# Altium schematic symbol library jlcpcb_2025_04_resistors_extended_2010.schlib: 1697 symbols (part 7 of 9)
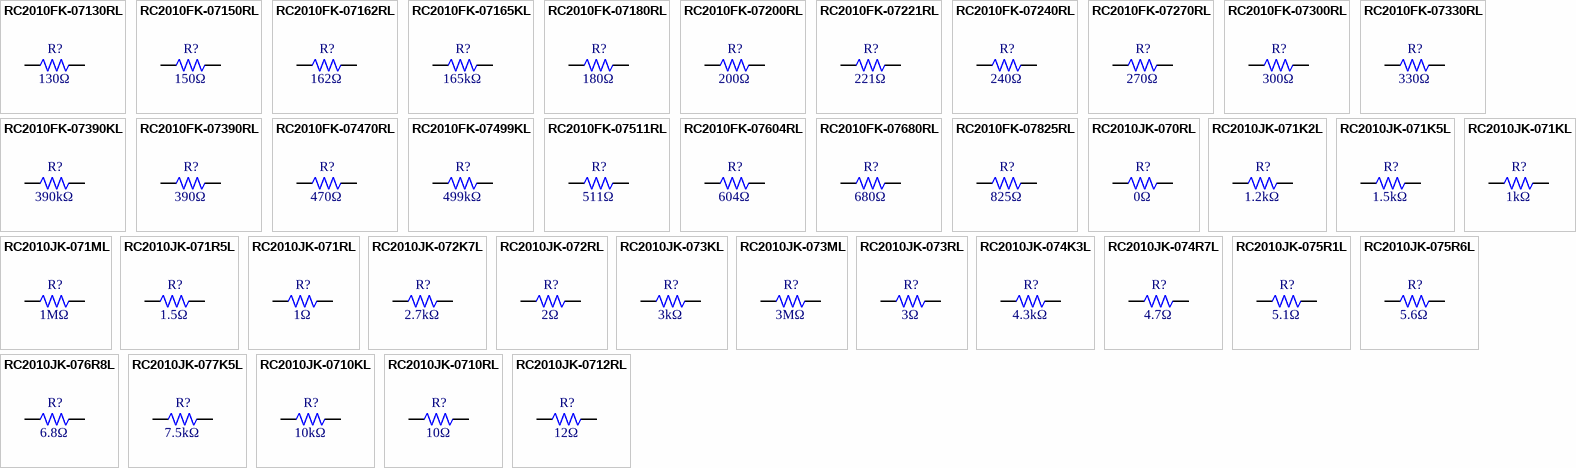
[diagram p48: symbols RC2010FK-07130RL to RC2010JK-0712RL]

## RC2010FK-07511RL
designator R?  Resistance: 511Ω  (hidden comment: *)
Resistor, 511Ω, ±1%, 750mW, 200V, ±100ppm/℃, -55℃~+155℃, SMD 2010; Manufacturer: Uniroyal; Manufacturer Part Number: RC2010FK-07511RL; Supplier 1: LCSC; Supplier Part Number 1: C137055; JLCPCB Part Number: C137055; Power Rating: 750mW; Category: Resistors; Package Size: 2010; JLCPCB Basic Part: Yes; Tolerance: ±1%; Voltage Rating: 200V; Temperature Coefficient: ±100ppm/℃; Temperature Rating: -55℃~+155℃; ComponentLink1Description: Datasheet; ComponentLink1URL: https://wmsc.lcsc.com/wmsc/upload/file/pdf/v2/lcsc/2304140030_YAGEO-RC2010FK-07511RL_C137055.pdf; ComponentLink2Description: JLCPCB Part URL; ComponentLink2URL: https://jlcpcb.com/partdetail/C137055
pins: 1, 2
1 alternate drawing of the same symbol

## RC2010FK-07604RL
designator R?  Resistance: 604Ω  (hidden comment: *)
Resistor, 604Ω, ±1%, 750mW, 200V, ±100ppm/℃, -55℃~+155℃, SMD 2010; Manufacturer: Uniroyal; Manufacturer Part Number: RC2010FK-07604RL; Supplier 1: LCSC; Supplier Part Number 1: C375685; JLCPCB Part Number: C375685; Power Rating: 750mW; Category: Resistors; Package Size: 2010; JLCPCB Basic Part: Yes; Tolerance: ±1%; Voltage Rating: 200V; Temperature Coefficient: ±100ppm/℃; Temperature Rating: -55℃~+155℃; ComponentLink1Description: Datasheet; ComponentLink1URL: https://wmsc.lcsc.com/wmsc/upload/file/pdf/v2/lcsc/1912111437_YAGEO-RC2010FK-07604RL_C375685.pdf; ComponentLink2Description: JLCPCB Part URL; ComponentLink2URL: https://jlcpcb.com/partdetail/C375685
pins: 1, 2
1 alternate drawing of the same symbol

## RC2010FK-07680RL
designator R?  Resistance: 680Ω  (hidden comment: *)
Resistor, 680Ω, ±1%, 750mW, 200V, ±100ppm/℃, -55℃~+155℃, SMD 2010; Manufacturer: Uniroyal; Manufacturer Part Number: RC2010FK-07680RL; Supplier 1: LCSC; Supplier Part Number 1: C137051; JLCPCB Part Number: C137051; Power Rating: 750mW; Category: Resistors; Package Size: 2010; JLCPCB Basic Part: Yes; Tolerance: ±1%; Voltage Rating: 200V; Temperature Coefficient: ±100ppm/℃; Temperature Rating: -55℃~+155℃; ComponentLink1Description: Datasheet; ComponentLink1URL: https://wmsc.lcsc.com/wmsc/upload/file/pdf/v2/lcsc/2304140030_YAGEO-RC2010FK-07680RL_C137051.pdf; ComponentLink2Description: JLCPCB Part URL; ComponentLink2URL: https://jlcpcb.com/partdetail/C137051
pins: 1, 2
1 alternate drawing of the same symbol

## RC2010FK-07825RL
designator R?  Resistance: 825Ω  (hidden comment: *)
Resistor, 825Ω, ±1%, 750mW, 200V, ±100ppm/℃, -55℃~+155℃, SMD 2010; Manufacturer: Uniroyal; Manufacturer Part Number: RC2010FK-07825RL; Supplier 1: LCSC; Supplier Part Number 1: C137049; JLCPCB Part Number: C137049; Power Rating: 750mW; Category: Resistors; Package Size: 2010; JLCPCB Basic Part: Yes; Tolerance: ±1%; Voltage Rating: 200V; Temperature Coefficient: ±100ppm/℃; Temperature Rating: -55℃~+155℃; ComponentLink1Description: Datasheet; ComponentLink1URL: https://wmsc.lcsc.com/wmsc/upload/file/pdf/v2/lcsc/2304140030_YAGEO-RC2010FK-07825RL_C137049.pdf; ComponentLink2Description: JLCPCB Part URL; ComponentLink2URL: https://jlcpcb.com/partdetail/C137049
pins: 1, 2
1 alternate drawing of the same symbol

## RC2010JK-070RL
designator R?  Resistance: 0Ω  (hidden comment: *)
Resistor, 0Ω, ±5%, 750mW, 200V, -55℃~+155℃, SMD 2010; Manufacturer: Uniroyal; Manufacturer Part Number: RC2010JK-070RL; Supplier 1: LCSC; Supplier Part Number 1: C152156; JLCPCB Part Number: C152156; Power Rating: 750mW; Category: Resistors; Package Size: 2010; JLCPCB Basic Part: Yes; Tolerance: ±5%; Voltage Rating: 200V; Temperature Rating: -55℃~+155℃; ComponentLink1Description: Datasheet; ComponentLink1URL: https://wmsc.lcsc.com/wmsc/upload/file/pdf/v2/lcsc/2304140030_YAGEO-RC2010JK-070RL_C152156.pdf; ComponentLink2Description: JLCPCB Part URL; ComponentLink2URL: https://jlcpcb.com/partdetail/C152156
pins: 1, 2
1 alternate drawing of the same symbol

## RC2010JK-071K2L
designator R?  Resistance: 1.2kΩ  (hidden comment: *)
Resistor, 1.2kΩ, ±5%, 750mW, 200V, ±100ppm/℃, -55℃~+155℃, SMD 2010; Manufacturer: Uniroyal; Manufacturer Part Number: RC2010JK-071K2L; Supplier 1: LCSC; Supplier Part Number 1: C137044; JLCPCB Part Number: C137044; Power Rating: 750mW; Category: Resistors; Package Size: 2010; JLCPCB Basic Part: Yes; Tolerance: ±5%; Voltage Rating: 200V; Temperature Coefficient: ±100ppm/℃; Temperature Rating: -55℃~+155℃; ComponentLink1Description: Datasheet; ComponentLink1URL: https://wmsc.lcsc.com/wmsc/upload/file/pdf/v2/lcsc/2304140030_YAGEO-RC2010JK-071K2L_C137044.pdf; ComponentLink2Description: JLCPCB Part URL; ComponentLink2URL: https://jlcpcb.com/partdetail/C137044
pins: 1, 2
1 alternate drawing of the same symbol

## RC2010JK-071K5L
designator R?  Resistance: 1.5kΩ  (hidden comment: *)
Resistor, 1.5kΩ, ±5%, 750mW, 200V, ±100ppm/℃, -55℃~+155℃, SMD 2010; Manufacturer: Uniroyal; Manufacturer Part Number: RC2010JK-071K5L; Supplier 1: LCSC; Supplier Part Number 1: C1883569; JLCPCB Part Number: C1883569; Power Rating: 750mW; Category: Resistors; Package Size: 2010; JLCPCB Basic Part: Yes; Tolerance: ±5%; Voltage Rating: 200V; Temperature Coefficient: ±100ppm/℃; Temperature Rating: -55℃~+155℃; ComponentLink1Description: Datasheet; ComponentLink1URL: https://wmsc.lcsc.com/wmsc/upload/file/pdf/v2/lcsc/2201280500_YAGEO-RC2010JK-071K5L_C1883569.pdf; ComponentLink2Description: JLCPCB Part URL; ComponentLink2URL: https://jlcpcb.com/partdetail/C1883569
pins: 1, 2
1 alternate drawing of the same symbol

## RC2010JK-071KL
designator R?  Resistance: 1kΩ  (hidden comment: *)
Resistor, 1kΩ, ±5%, 750mW, 200V, ±100ppm/℃, -55℃~+155℃, SMD 2010; Manufacturer: Uniroyal; Manufacturer Part Number: RC2010JK-071KL; Supplier 1: LCSC; Supplier Part Number 1: C163345; JLCPCB Part Number: C163345; Power Rating: 750mW; Category: Resistors; Package Size: 2010; JLCPCB Basic Part: Yes; Tolerance: ±5%; Voltage Rating: 200V; Temperature Coefficient: ±100ppm/℃; Temperature Rating: -55℃~+155℃; ComponentLink1Description: Datasheet; ComponentLink1URL: https://wmsc.lcsc.com/wmsc/upload/file/pdf/v2/lcsc/2304140030_YAGEO-RC2010JK-071KL_C163345.pdf; ComponentLink2Description: JLCPCB Part URL; ComponentLink2URL: https://jlcpcb.com/partdetail/C163345
pins: 1, 2
1 alternate drawing of the same symbol

## RC2010JK-071ML
designator R?  Resistance: 1MΩ  (hidden comment: *)
Resistor, 1MΩ, ±5%, 750mW, 200V, ±100ppm/℃, -55℃~+155℃, SMD 2010; Manufacturer: Uniroyal; Manufacturer Part Number: RC2010JK-071ML; Supplier 1: LCSC; Supplier Part Number 1: C1883562; JLCPCB Part Number: C1883562; Power Rating: 750mW; Category: Resistors; Package Size: 2010; JLCPCB Basic Part: Yes; Tolerance: ±5%; Voltage Rating: 200V; Temperature Coefficient: ±100ppm/℃; Temperature Rating: -55℃~+155℃; ComponentLink1Description: Datasheet; ComponentLink1URL: https://wmsc.lcsc.com/wmsc/upload/file/pdf/v2/lcsc/2201280500_YAGEO-RC2010JK-071ML_C1883562.pdf; ComponentLink2Description: JLCPCB Part URL; ComponentLink2URL: https://jlcpcb.com/partdetail/C1883562
pins: 1, 2
1 alternate drawing of the same symbol

## RC2010JK-071R5L
designator R?  Resistance: 1.5Ω  (hidden comment: *)
Resistor, 1.5Ω, ±5%, 750mW, 200V, ±200ppm/℃, -55℃~+155℃, SMD 2010; Manufacturer: Uniroyal; Manufacturer Part Number: RC2010JK-071R5L; Supplier 1: LCSC; Supplier Part Number 1: C326637; JLCPCB Part Number: C326637; Power Rating: 750mW; Category: Resistors; Package Size: 2010; JLCPCB Basic Part: Yes; Tolerance: ±5%; Voltage Rating: 200V; Temperature Coefficient: ±200ppm/℃; Temperature Rating: -55℃~+155℃; ComponentLink1Description: Datasheet; ComponentLink1URL: https://wmsc.lcsc.com/wmsc/upload/file/pdf/v2/lcsc/1811141450_YAGEO-RC2010JK-071R5L_C326637.pdf; ComponentLink2Description: JLCPCB Part URL; ComponentLink2URL: https://jlcpcb.com/partdetail/C326637
pins: 1, 2
1 alternate drawing of the same symbol

## RC2010JK-071RL
designator R?  Resistance: 1Ω  (hidden comment: *)
Resistor, 1Ω, ±5%, 750mW, 200V, ±200ppm/℃, -55℃~+155℃, SMD 2010; Manufacturer: Uniroyal; Manufacturer Part Number: RC2010JK-071RL; Supplier 1: LCSC; Supplier Part Number 1: C137043; JLCPCB Part Number: C137043; Power Rating: 750mW; Category: Resistors; Package Size: 2010; JLCPCB Basic Part: Yes; Tolerance: ±5%; Voltage Rating: 200V; Temperature Coefficient: ±200ppm/℃; Temperature Rating: -55℃~+155℃; ComponentLink1Description: Datasheet; ComponentLink1URL: https://wmsc.lcsc.com/wmsc/upload/file/pdf/v2/lcsc/2304140030_YAGEO-RC2010JK-071RL_C137043.pdf; ComponentLink2Description: JLCPCB Part URL; ComponentLink2URL: https://jlcpcb.com/partdetail/C137043
pins: 1, 2
1 alternate drawing of the same symbol

## RC2010JK-072K7L
designator R?  Resistance: 2.7kΩ  (hidden comment: *)
Resistor, 2.7kΩ, ±5%, 750mW, 200V, ±100ppm/℃, -55℃~+155℃, SMD 2010; Manufacturer: Uniroyal; Manufacturer Part Number: RC2010JK-072K7L; Supplier 1: LCSC; Supplier Part Number 1: C1883563; JLCPCB Part Number: C1883563; Power Rating: 750mW; Category: Resistors; Package Size: 2010; JLCPCB Basic Part: Yes; Tolerance: ±5%; Voltage Rating: 200V; Temperature Coefficient: ±100ppm/℃; Temperature Rating: -55℃~+155℃; ComponentLink1Description: Datasheet; ComponentLink1URL: https://wmsc.lcsc.com/wmsc/upload/file/pdf/v2/lcsc/2201280500_YAGEO-RC2010JK-072K7L_C1883563.pdf; ComponentLink2Description: JLCPCB Part URL; ComponentLink2URL: https://jlcpcb.com/partdetail/C1883563
pins: 1, 2
1 alternate drawing of the same symbol

## RC2010JK-072RL
designator R?  Resistance: 2Ω  (hidden comment: *)
Resistor, 2Ω, ±5%, 750mW, 200V, ±200ppm/℃, -55℃~+155℃, SMD 2010; Manufacturer: Uniroyal; Manufacturer Part Number: RC2010JK-072RL; Supplier 1: LCSC; Supplier Part Number 1: C137040; JLCPCB Part Number: C137040; Power Rating: 750mW; Category: Resistors; Package Size: 2010; JLCPCB Basic Part: Yes; Tolerance: ±5%; Voltage Rating: 200V; Temperature Coefficient: ±200ppm/℃; Temperature Rating: -55℃~+155℃; ComponentLink1Description: Datasheet; ComponentLink1URL: https://wmsc.lcsc.com/wmsc/upload/file/pdf/v2/lcsc/2304140030_YAGEO-RC2010JK-072RL_C137040.pdf; ComponentLink2Description: JLCPCB Part URL; ComponentLink2URL: https://jlcpcb.com/partdetail/C137040
pins: 1, 2
1 alternate drawing of the same symbol

## RC2010JK-073KL
designator R?  Resistance: 3kΩ  (hidden comment: *)
Resistor, 3kΩ, ±5%, 750mW, 200V, ±100ppm/℃, -55℃~+155℃, SMD 2010; Manufacturer: Uniroyal; Manufacturer Part Number: RC2010JK-073KL; Supplier 1: LCSC; Supplier Part Number 1: C2962217; JLCPCB Part Number: C2962217; Power Rating: 750mW; Category: Resistors; Package Size: 2010; JLCPCB Basic Part: Yes; Tolerance: ±5%; Voltage Rating: 200V; Temperature Coefficient: ±100ppm/℃; Temperature Rating: -55℃~+155℃; ComponentLink1Description: Datasheet; ComponentLink1URL: https://wmsc.lcsc.com/wmsc/upload/file/pdf/v2/lcsc/2201181800_YAGEO-RC2010JK-073KL_C2962217.pdf; ComponentLink2Description: JLCPCB Part URL; ComponentLink2URL: https://jlcpcb.com/partdetail/C2962217
pins: 1, 2
1 alternate drawing of the same symbol

## RC2010JK-073ML
designator R?  Resistance: 3MΩ  (hidden comment: *)
Resistor, 3MΩ, ±5%, 750mW, 200V, ±100ppm/℃, -55℃~+155℃, SMD 2010; Manufacturer: Uniroyal; Manufacturer Part Number: RC2010JK-073ML; Supplier 1: LCSC; Supplier Part Number 1: C914849; JLCPCB Part Number: C914849; Power Rating: 750mW; Category: Resistors; Package Size: 2010; JLCPCB Basic Part: Yes; Tolerance: ±5%; Voltage Rating: 200V; Temperature Coefficient: ±100ppm/℃; Temperature Rating: -55℃~+155℃; ComponentLink1Description: Datasheet; ComponentLink1URL: https://wmsc.lcsc.com/wmsc/upload/file/pdf/v2/lcsc/2011202108_YAGEO-RC2010JK-073ML_C914849.pdf; ComponentLink2Description: JLCPCB Part URL; ComponentLink2URL: https://jlcpcb.com/partdetail/C914849
pins: 1, 2
1 alternate drawing of the same symbol

## RC2010JK-073RL
designator R?  Resistance: 3Ω  (hidden comment: *)
Resistor, 3Ω, ±5%, 750mW, 200V, ±200ppm/℃, -55℃~+155℃, SMD 2010; Manufacturer: Uniroyal; Manufacturer Part Number: RC2010JK-073RL; Supplier 1: LCSC; Supplier Part Number 1: C606211; JLCPCB Part Number: C606211; Power Rating: 750mW; Category: Resistors; Package Size: 2010; JLCPCB Basic Part: Yes; Tolerance: ±5%; Voltage Rating: 200V; Temperature Coefficient: ±200ppm/℃; Temperature Rating: -55℃~+155℃; ComponentLink1Description: Datasheet; ComponentLink1URL: https://wmsc.lcsc.com/wmsc/upload/file/pdf/v2/lcsc/2006112334_YAGEO-RC2010JK-073RL_C606211.pdf; ComponentLink2Description: JLCPCB Part URL; ComponentLink2URL: https://jlcpcb.com/partdetail/C606211
pins: 1, 2
1 alternate drawing of the same symbol

## RC2010JK-074K3L
designator R?  Resistance: 4.3kΩ  (hidden comment: *)
Resistor, 4.3kΩ, ±5%, 750mW, ±100ppm/℃, -55℃~+155℃, SMD 2010; Manufacturer: Uniroyal; Manufacturer Part Number: RC2010JK-074K3L; Supplier 1: LCSC; Supplier Part Number 1: C723510; JLCPCB Part Number: C723510; Power Rating: 750mW; Category: Resistors; Package Size: 2010; JLCPCB Basic Part: Yes; Tolerance: ±5%; Temperature Coefficient: ±100ppm/℃; Temperature Rating: -55℃~+155℃; ComponentLink1Description: Datasheet; ComponentLink1URL: https://wmsc.lcsc.com/wmsc/upload/file/pdf/v2/lcsc/2008171307_YAGEO-RC2010JK-074K3L_C723510.pdf; ComponentLink2Description: JLCPCB Part URL; ComponentLink2URL: https://jlcpcb.com/partdetail/C723510
pins: 1, 2
1 alternate drawing of the same symbol

## RC2010JK-074R7L
designator R?  Resistance: 4.7Ω  (hidden comment: *)
Resistor, 4.7Ω, ±5%, 750mW, 200V, ±200ppm/℃, -55℃~+155℃, SMD 2010; Manufacturer: Uniroyal; Manufacturer Part Number: RC2010JK-074R7L; Supplier 1: LCSC; Supplier Part Number 1: C1883580; JLCPCB Part Number: C1883580; Power Rating: 750mW; Category: Resistors; Package Size: 2010; JLCPCB Basic Part: Yes; Tolerance: ±5%; Voltage Rating: 200V; Temperature Coefficient: ±200ppm/℃; Temperature Rating: -55℃~+155℃; ComponentLink1Description: Datasheet; ComponentLink1URL: https://wmsc.lcsc.com/wmsc/upload/file/pdf/v2/lcsc/2201280500_YAGEO-RC2010JK-074R7L_C1883580.pdf; ComponentLink2Description: JLCPCB Part URL; ComponentLink2URL: https://jlcpcb.com/partdetail/C1883580
pins: 1, 2
1 alternate drawing of the same symbol

## RC2010JK-075R1L
designator R?  Resistance: 5.1Ω  (hidden comment: *)
Resistor, 5.1Ω, ±5%, 750mW, 200V, ±200ppm/℃, -55℃~+155℃, SMD 2010; Manufacturer: Uniroyal; Manufacturer Part Number: RC2010JK-075R1L; Supplier 1: LCSC; Supplier Part Number 1: C606212; JLCPCB Part Number: C606212; Power Rating: 750mW; Category: Resistors; Package Size: 2010; JLCPCB Basic Part: Yes; Tolerance: ±5%; Voltage Rating: 200V; Temperature Coefficient: ±200ppm/℃; Temperature Rating: -55℃~+155℃; ComponentLink1Description: Datasheet; ComponentLink1URL: https://wmsc.lcsc.com/wmsc/upload/file/pdf/v2/lcsc/2006112334_YAGEO-RC2010JK-075R1L_C606212.pdf; ComponentLink2Description: JLCPCB Part URL; ComponentLink2URL: https://jlcpcb.com/partdetail/C606212
pins: 1, 2
1 alternate drawing of the same symbol

## RC2010JK-075R6L
designator R?  Resistance: 5.6Ω  (hidden comment: *)
Resistor, 5.6Ω, ±5%, 750mW, 200V, ±200ppm/℃, -55℃~+155℃, SMD 2010; Manufacturer: Uniroyal; Manufacturer Part Number: RC2010JK-075R6L; Supplier 1: LCSC; Supplier Part Number 1: C326636; JLCPCB Part Number: C326636; Power Rating: 750mW; Category: Resistors; Package Size: 2010; JLCPCB Basic Part: Yes; Tolerance: ±5%; Voltage Rating: 200V; Temperature Coefficient: ±200ppm/℃; Temperature Rating: -55℃~+155℃; ComponentLink1Description: Datasheet; ComponentLink1URL: https://wmsc.lcsc.com/wmsc/upload/file/pdf/v2/lcsc/1811141450_YAGEO-RC2010JK-075R6L_C326636.pdf; ComponentLink2Description: JLCPCB Part URL; ComponentLink2URL: https://jlcpcb.com/partdetail/C326636
pins: 1, 2
1 alternate drawing of the same symbol

## RC2010JK-076R8L
designator R?  Resistance: 6.8Ω  (hidden comment: *)
Resistor, 6.8Ω, ±5%, 750mW, 200V, ±200ppm/℃, -55℃~+155℃, SMD 2010; Manufacturer: Uniroyal; Manufacturer Part Number: RC2010JK-076R8L; Supplier 1: LCSC; Supplier Part Number 1: C326635; JLCPCB Part Number: C326635; Power Rating: 750mW; Category: Resistors; Package Size: 2010; JLCPCB Basic Part: Yes; Tolerance: ±5%; Voltage Rating: 200V; Temperature Coefficient: ±200ppm/℃; Temperature Rating: -55℃~+155℃; ComponentLink1Description: Datasheet; ComponentLink1URL: https://wmsc.lcsc.com/wmsc/upload/file/pdf/v2/lcsc/1811141444_YAGEO-RC2010JK-076R8L_C326635.pdf; ComponentLink2Description: JLCPCB Part URL; ComponentLink2URL: https://jlcpcb.com/partdetail/C326635
pins: 1, 2
1 alternate drawing of the same symbol

## RC2010JK-077K5L
designator R?  Resistance: 7.5kΩ  (hidden comment: *)
Resistor, 7.5kΩ, ±5%, 750mW, 200V, ±100ppm/℃, -55℃~+155℃, SMD 2010; Manufacturer: Uniroyal; Manufacturer Part Number: RC2010JK-077K5L; Supplier 1: LCSC; Supplier Part Number 1: C606214; JLCPCB Part Number: C606214; Power Rating: 750mW; Category: Resistors; Package Size: 2010; JLCPCB Basic Part: Yes; Tolerance: ±5%; Voltage Rating: 200V; Temperature Coefficient: ±100ppm/℃; Temperature Rating: -55℃~+155℃; ComponentLink1Description: Datasheet; ComponentLink1URL: https://wmsc.lcsc.com/wmsc/upload/file/pdf/v2/lcsc/2006112334_YAGEO-RC2010JK-077K5L_C606214.pdf; ComponentLink2Description: JLCPCB Part URL; ComponentLink2URL: https://jlcpcb.com/partdetail/C606214
pins: 1, 2
1 alternate drawing of the same symbol

## RC2010JK-0710KL
designator R?  Resistance: 10kΩ  (hidden comment: *)
Resistor, 10kΩ, ±5%, 750mW, 200V, ±100ppm/℃, -55℃~+155℃, SMD 2010; Manufacturer: Uniroyal; Manufacturer Part Number: RC2010JK-0710KL; Supplier 1: LCSC; Supplier Part Number 1: C309600; JLCPCB Part Number: C309600; Power Rating: 750mW; Category: Resistors; Package Size: 2010; JLCPCB Basic Part: Yes; Tolerance: ±5%; Voltage Rating: 200V; Temperature Coefficient: ±100ppm/℃; Temperature Rating: -55℃~+155℃; ComponentLink1Description: Datasheet; ComponentLink1URL: https://wmsc.lcsc.com/wmsc/upload/file/pdf/v2/lcsc/2304140030_YAGEO-RC2010JK-0710KL_C309600.pdf; ComponentLink2Description: JLCPCB Part URL; ComponentLink2URL: https://jlcpcb.com/partdetail/C309600
pins: 1, 2
1 alternate drawing of the same symbol

## RC2010JK-0710RL
designator R?  Resistance: 10Ω  (hidden comment: *)
Resistor, 10Ω, ±5%, 750mW, 200V, ±200ppm/℃, -55℃~+155℃, SMD 2010; Manufacturer: Uniroyal; Manufacturer Part Number: RC2010JK-0710RL; Supplier 1: LCSC; Supplier Part Number 1: C137048; JLCPCB Part Number: C137048; Power Rating: 750mW; Category: Resistors; Package Size: 2010; JLCPCB Basic Part: Yes; Tolerance: ±5%; Voltage Rating: 200V; Temperature Coefficient: ±200ppm/℃; Temperature Rating: -55℃~+155℃; ComponentLink1Description: Datasheet; ComponentLink1URL: https://wmsc.lcsc.com/wmsc/upload/file/pdf/v2/lcsc/2304140030_YAGEO-RC2010JK-0710RL_C137048.pdf; ComponentLink2Description: JLCPCB Part URL; ComponentLink2URL: https://jlcpcb.com/partdetail/C137048
pins: 1, 2
1 alternate drawing of the same symbol

## RC2010JK-0712RL
designator R?  Resistance: 12Ω  (hidden comment: *)
Resistor, 12Ω, ±5%, 750mW, 200V, ±100ppm/℃, -55℃~+155℃, SMD 2010; Manufacturer: Uniroyal; Manufacturer Part Number: RC2010JK-0712RL; Supplier 1: LCSC; Supplier Part Number 1: C606206; JLCPCB Part Number: C606206; Power Rating: 750mW; Category: Resistors; Package Size: 2010; JLCPCB Basic Part: Yes; Tolerance: ±5%; Voltage Rating: 200V; Temperature Coefficient: ±100ppm/℃; Temperature Rating: -55℃~+155℃; ComponentLink1Description: Datasheet; ComponentLink1URL: https://wmsc.lcsc.com/wmsc/upload/file/pdf/v2/lcsc/2006112333_YAGEO-RC2010JK-0712RL_C606206.pdf; ComponentLink2Description: JLCPCB Part URL; ComponentLink2URL: https://jlcpcb.com/partdetail/C606206
pins: 1, 2
1 alternate drawing of the same symbol

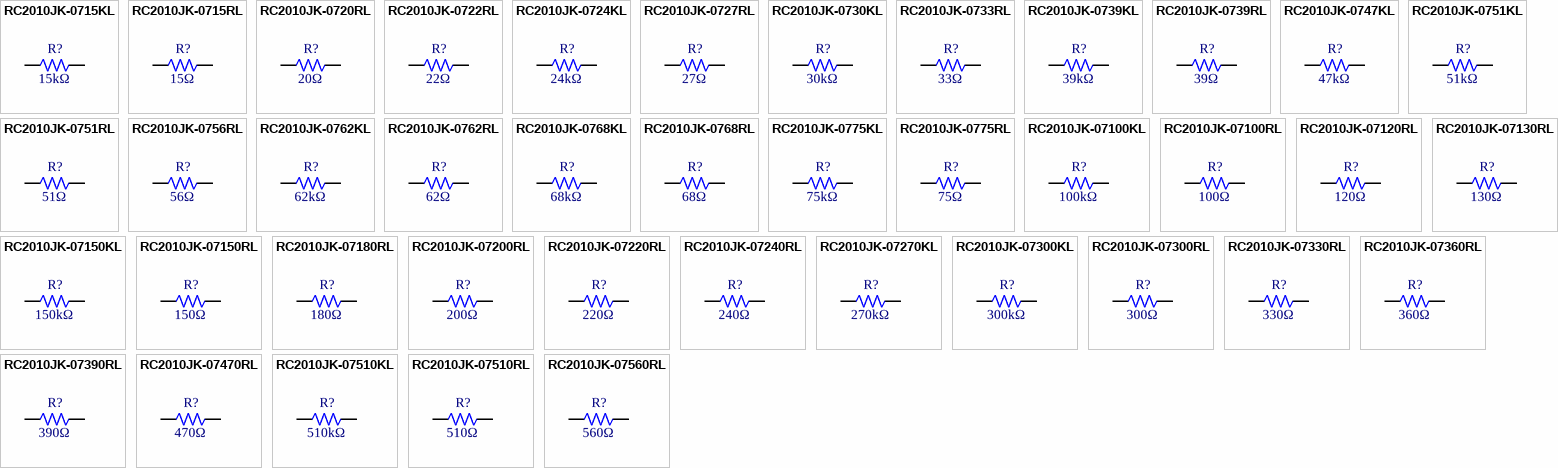
[diagram p30: symbols RC2010JK-0715KL to RC2010JK-07560RL]

## RC2010JK-0715KL
designator R?  Resistance: 15kΩ  (hidden comment: *)
Resistor, 15kΩ, ±5%, 750mW, 200V, ±100ppm/℃, -55℃~+155℃, SMD 2010; Manufacturer: Uniroyal; Manufacturer Part Number: RC2010JK-0715KL; Supplier 1: LCSC; Supplier Part Number 1: C326818; JLCPCB Part Number: C326818; Power Rating: 750mW; Category: Resistors; Package Size: 2010; JLCPCB Basic Part: Yes; Tolerance: ±5%; Voltage Rating: 200V; Temperature Coefficient: ±100ppm/℃; Temperature Rating: -55℃~+155℃; ComponentLink1Description: Datasheet; ComponentLink1URL: https://wmsc.lcsc.com/wmsc/upload/file/pdf/v2/lcsc/1811141443_YAGEO-RC2010JK-0715KL_C326818.pdf; ComponentLink2Description: JLCPCB Part URL; ComponentLink2URL: https://jlcpcb.com/partdetail/C326818
pins: 1, 2
1 alternate drawing of the same symbol

## RC2010JK-0715RL
designator R?  Resistance: 15Ω  (hidden comment: *)
Resistor, 15Ω, ±5%, 750mW, 200V, ±100ppm/℃, -55℃~+155℃, SMD 2010; Manufacturer: Uniroyal; Manufacturer Part Number: RC2010JK-0715RL; Supplier 1: LCSC; Supplier Part Number 1: C137045; JLCPCB Part Number: C137045; Power Rating: 750mW; Category: Resistors; Package Size: 2010; JLCPCB Basic Part: Yes; Tolerance: ±5%; Voltage Rating: 200V; Temperature Coefficient: ±100ppm/℃; Temperature Rating: -55℃~+155℃; ComponentLink1Description: Datasheet; ComponentLink1URL: https://wmsc.lcsc.com/wmsc/upload/file/pdf/v2/lcsc/2304140030_YAGEO-RC2010JK-0715RL_C137045.pdf; ComponentLink2Description: JLCPCB Part URL; ComponentLink2URL: https://jlcpcb.com/partdetail/C137045
pins: 1, 2
1 alternate drawing of the same symbol

## RC2010JK-0720RL
designator R?  Resistance: 20Ω  (hidden comment: *)
Resistor, 20Ω, ±5%, 750mW, 200V, ±100ppm/℃, -55℃~+155℃, SMD 2010; Manufacturer: Uniroyal; Manufacturer Part Number: RC2010JK-0720RL; Supplier 1: LCSC; Supplier Part Number 1: C163344; JLCPCB Part Number: C163344; Power Rating: 750mW; Category: Resistors; Package Size: 2010; JLCPCB Basic Part: Yes; Tolerance: ±5%; Voltage Rating: 200V; Temperature Coefficient: ±100ppm/℃; Temperature Rating: -55℃~+155℃; ComponentLink1Description: Datasheet; ComponentLink1URL: https://wmsc.lcsc.com/wmsc/upload/file/pdf/v2/lcsc/2304140030_YAGEO-RC2010JK-0720RL_C163344.pdf; ComponentLink2Description: JLCPCB Part URL; ComponentLink2URL: https://jlcpcb.com/partdetail/C163344
pins: 1, 2
1 alternate drawing of the same symbol

## RC2010JK-0722RL
designator R?  Resistance: 22Ω  (hidden comment: *)
Resistor, 22Ω, ±5%, 750mW, 200V, ±100ppm/℃, -55℃~+155℃, SMD 2010; Manufacturer: Uniroyal; Manufacturer Part Number: RC2010JK-0722RL; Supplier 1: LCSC; Supplier Part Number 1: C137041; JLCPCB Part Number: C137041; Power Rating: 750mW; Category: Resistors; Package Size: 2010; JLCPCB Basic Part: Yes; Tolerance: ±5%; Voltage Rating: 200V; Temperature Coefficient: ±100ppm/℃; Temperature Rating: -55℃~+155℃; ComponentLink1Description: Datasheet; ComponentLink1URL: https://wmsc.lcsc.com/wmsc/upload/file/pdf/v2/lcsc/2304140030_YAGEO-RC2010JK-0722RL_C137041.pdf; ComponentLink2Description: JLCPCB Part URL; ComponentLink2URL: https://jlcpcb.com/partdetail/C137041
pins: 1, 2
1 alternate drawing of the same symbol

## RC2010JK-0724KL
designator R?  Resistance: 24kΩ  (hidden comment: *)
Resistor, 24kΩ, ±5%, 750mW, 200V, ±100ppm/℃, -55℃~+155℃, SMD 2010; Manufacturer: Uniroyal; Manufacturer Part Number: RC2010JK-0724KL; Supplier 1: LCSC; Supplier Part Number 1: C326808; JLCPCB Part Number: C326808; Power Rating: 750mW; Category: Resistors; Package Size: 2010; JLCPCB Basic Part: Yes; Tolerance: ±5%; Voltage Rating: 200V; Temperature Coefficient: ±100ppm/℃; Temperature Rating: -55℃~+155℃; ComponentLink1Description: Datasheet; ComponentLink1URL: https://wmsc.lcsc.com/wmsc/upload/file/pdf/v2/lcsc/1811141443_YAGEO-RC2010JK-0724KL_C326808.pdf; ComponentLink2Description: JLCPCB Part URL; ComponentLink2URL: https://jlcpcb.com/partdetail/C326808
pins: 1, 2
1 alternate drawing of the same symbol

## RC2010JK-0727RL
designator R?  Resistance: 27Ω  (hidden comment: *)
Resistor, 27Ω, ±5%, 750mW, 200V, ±100ppm/℃, -55℃~+155℃, SMD 2010; Manufacturer: Uniroyal; Manufacturer Part Number: RC2010JK-0727RL; Supplier 1: LCSC; Supplier Part Number 1: C1883572; JLCPCB Part Number: C1883572; Power Rating: 750mW; Category: Resistors; Package Size: 2010; JLCPCB Basic Part: Yes; Tolerance: ±5%; Voltage Rating: 200V; Temperature Coefficient: ±100ppm/℃; Temperature Rating: -55℃~+155℃; ComponentLink1Description: Datasheet; ComponentLink1URL: https://wmsc.lcsc.com/wmsc/upload/file/pdf/v2/lcsc/2201280500_YAGEO-RC2010JK-0727RL_C1883572.pdf; ComponentLink2Description: JLCPCB Part URL; ComponentLink2URL: https://jlcpcb.com/partdetail/C1883572
pins: 1, 2
1 alternate drawing of the same symbol

## RC2010JK-0730KL
designator R?  Resistance: 30kΩ  (hidden comment: *)
Resistor, 30kΩ, ±5%, 750mW, 200V, ±100ppm/℃, -55℃~+155℃, SMD 2010; Manufacturer: Uniroyal; Manufacturer Part Number: RC2010JK-0730KL; Supplier 1: LCSC; Supplier Part Number 1: C2935245; JLCPCB Part Number: C2935245; Power Rating: 750mW; Category: Resistors; Package Size: 2010; JLCPCB Basic Part: Yes; Tolerance: ±5%; Voltage Rating: 200V; Temperature Coefficient: ±100ppm/℃; Temperature Rating: -55℃~+155℃; ComponentLink1Description: Datasheet; ComponentLink1URL: https://wmsc.lcsc.com/wmsc/upload/file/pdf/v2/lcsc/2201121700_YAGEO-RC2010JK-0730KL_C2935245.pdf; ComponentLink2Description: JLCPCB Part URL; ComponentLink2URL: https://jlcpcb.com/partdetail/C2935245
pins: 1, 2
1 alternate drawing of the same symbol

## RC2010JK-0733RL
designator R?  Resistance: 33Ω  (hidden comment: *)
Resistor, 33Ω, ±5%, 750mW, 200V, ±100ppm/℃, -55℃~+155℃, SMD 2010; Manufacturer: Uniroyal; Manufacturer Part Number: RC2010JK-0733RL; Supplier 1: LCSC; Supplier Part Number 1: C137038; JLCPCB Part Number: C137038; Power Rating: 750mW; Category: Resistors; Package Size: 2010; JLCPCB Basic Part: Yes; Tolerance: ±5%; Voltage Rating: 200V; Temperature Coefficient: ±100ppm/℃; Temperature Rating: -55℃~+155℃; ComponentLink1Description: Datasheet; ComponentLink1URL: https://wmsc.lcsc.com/wmsc/upload/file/pdf/v2/lcsc/2304140030_YAGEO-RC2010JK-0733RL_C137038.pdf; ComponentLink2Description: JLCPCB Part URL; ComponentLink2URL: https://jlcpcb.com/partdetail/C137038
pins: 1, 2
1 alternate drawing of the same symbol

## RC2010JK-0739KL
designator R?  Resistance: 39kΩ  (hidden comment: *)
Resistor, 39kΩ, ±5%, 750mW, 200V, ±100ppm/℃, -55℃~+155℃, SMD 2010; Manufacturer: Uniroyal; Manufacturer Part Number: RC2010JK-0739KL; Supplier 1: LCSC; Supplier Part Number 1: C2935246; JLCPCB Part Number: C2935246; Power Rating: 750mW; Category: Resistors; Package Size: 2010; JLCPCB Basic Part: Yes; Tolerance: ±5%; Voltage Rating: 200V; Temperature Coefficient: ±100ppm/℃; Temperature Rating: -55℃~+155℃; ComponentLink1Description: Datasheet; ComponentLink1URL: https://wmsc.lcsc.com/wmsc/upload/file/pdf/v2/lcsc/2201121700_YAGEO-RC2010JK-0739KL_C2935246.pdf; ComponentLink2Description: JLCPCB Part URL; ComponentLink2URL: https://jlcpcb.com/partdetail/C2935246
pins: 1, 2
1 alternate drawing of the same symbol

## RC2010JK-0739RL
designator R?  Resistance: 39Ω  (hidden comment: *)
Resistor, 39Ω, ±5%, 750mW, 200V, ±100ppm/℃, -55℃~+155℃, SMD 2010; Manufacturer: Uniroyal; Manufacturer Part Number: RC2010JK-0739RL; Supplier 1: LCSC; Supplier Part Number 1: C1883551; JLCPCB Part Number: C1883551; Power Rating: 750mW; Category: Resistors; Package Size: 2010; JLCPCB Basic Part: Yes; Tolerance: ±5%; Voltage Rating: 200V; Temperature Coefficient: ±100ppm/℃; Temperature Rating: -55℃~+155℃; ComponentLink1Description: Datasheet; ComponentLink1URL: https://wmsc.lcsc.com/wmsc/upload/file/pdf/v2/lcsc/2201280500_YAGEO-RC2010JK-0739RL_C1883551.pdf; ComponentLink2Description: JLCPCB Part URL; ComponentLink2URL: https://jlcpcb.com/partdetail/C1883551
pins: 1, 2
1 alternate drawing of the same symbol

## RC2010JK-0747KL
designator R?  Resistance: 47kΩ  (hidden comment: *)
Resistor, 47kΩ, ±5%, 750mW, 200V, ±100ppm/℃, -55℃~+155℃, SMD 2010; Manufacturer: Uniroyal; Manufacturer Part Number: RC2010JK-0747KL; Supplier 1: LCSC; Supplier Part Number 1: C137037; JLCPCB Part Number: C137037; Power Rating: 750mW; Category: Resistors; Package Size: 2010; JLCPCB Basic Part: Yes; Tolerance: ±5%; Voltage Rating: 200V; Temperature Coefficient: ±100ppm/℃; Temperature Rating: -55℃~+155℃; ComponentLink1Description: Datasheet; ComponentLink1URL: https://wmsc.lcsc.com/wmsc/upload/file/pdf/v2/lcsc/2304140030_YAGEO-RC2010JK-0747KL_C137037.pdf; ComponentLink2Description: JLCPCB Part URL; ComponentLink2URL: https://jlcpcb.com/partdetail/C137037
pins: 1, 2
1 alternate drawing of the same symbol

## RC2010JK-0751KL
designator R?  Resistance: 51kΩ  (hidden comment: *)
Resistor, 51kΩ, ±5%, 750mW, 200V, ±100ppm/℃, -55℃~+155℃, SMD 2010; Manufacturer: Uniroyal; Manufacturer Part Number: RC2010JK-0751KL; Supplier 1: LCSC; Supplier Part Number 1: C326814; JLCPCB Part Number: C326814; Power Rating: 750mW; Category: Resistors; Package Size: 2010; JLCPCB Basic Part: Yes; Tolerance: ±5%; Voltage Rating: 200V; Temperature Coefficient: ±100ppm/℃; Temperature Rating: -55℃~+155℃; ComponentLink1Description: Datasheet; ComponentLink1URL: https://wmsc.lcsc.com/wmsc/upload/file/pdf/v2/lcsc/1811141444_YAGEO-RC2010JK-0751KL_C326814.pdf; ComponentLink2Description: JLCPCB Part URL; ComponentLink2URL: https://jlcpcb.com/partdetail/C326814
pins: 1, 2
1 alternate drawing of the same symbol

## RC2010JK-0751RL
designator R?  Resistance: 51Ω  (hidden comment: *)
Resistor, 51Ω, ±5%, 750mW, 200V, ±100ppm/℃, -55℃~+155℃, SMD 2010; Manufacturer: Uniroyal; Manufacturer Part Number: RC2010JK-0751RL; Supplier 1: LCSC; Supplier Part Number 1: C393664; JLCPCB Part Number: C393664; Power Rating: 750mW; Category: Resistors; Package Size: 2010; JLCPCB Basic Part: Yes; Tolerance: ±5%; Voltage Rating: 200V; Temperature Coefficient: ±100ppm/℃; Temperature Rating: -55℃~+155℃; ComponentLink1Description: Datasheet; ComponentLink1URL: https://wmsc.lcsc.com/wmsc/upload/file/pdf/v2/lcsc/1912111437_YAGEO-RC2010JK-0751RL_C393664.pdf; ComponentLink2Description: JLCPCB Part URL; ComponentLink2URL: https://jlcpcb.com/partdetail/C393664
pins: 1, 2
1 alternate drawing of the same symbol

## RC2010JK-0756RL
designator R?  Resistance: 56Ω  (hidden comment: *)
Resistor, 56Ω, ±5%, 750mW, 200V, ±100ppm/℃, -55℃~+155℃, SMD 2010; Manufacturer: Uniroyal; Manufacturer Part Number: RC2010JK-0756RL; Supplier 1: LCSC; Supplier Part Number 1: C1883560; JLCPCB Part Number: C1883560; Power Rating: 750mW; Category: Resistors; Package Size: 2010; JLCPCB Basic Part: Yes; Tolerance: ±5%; Voltage Rating: 200V; Temperature Coefficient: ±100ppm/℃; Temperature Rating: -55℃~+155℃; ComponentLink1Description: Datasheet; ComponentLink1URL: https://wmsc.lcsc.com/wmsc/upload/file/pdf/v2/lcsc/2201280500_YAGEO-RC2010JK-0756RL_C1883560.pdf; ComponentLink2Description: JLCPCB Part URL; ComponentLink2URL: https://jlcpcb.com/partdetail/C1883560
pins: 1, 2
1 alternate drawing of the same symbol

## RC2010JK-0762KL
designator R?  Resistance: 62kΩ  (hidden comment: *)
Resistor, 62kΩ, ±5%, 750mW, 200V, ±100ppm/℃, -55℃~+155℃, SMD 2010; Manufacturer: Uniroyal; Manufacturer Part Number: RC2010JK-0762KL; Supplier 1: LCSC; Supplier Part Number 1: C137034; JLCPCB Part Number: C137034; Power Rating: 750mW; Category: Resistors; Package Size: 2010; JLCPCB Basic Part: Yes; Tolerance: ±5%; Voltage Rating: 200V; Temperature Coefficient: ±100ppm/℃; Temperature Rating: -55℃~+155℃; ComponentLink1Description: Datasheet; ComponentLink1URL: https://wmsc.lcsc.com/wmsc/upload/file/pdf/v2/lcsc/2304140030_YAGEO-RC2010JK-0762KL_C137034.pdf; ComponentLink2Description: JLCPCB Part URL; ComponentLink2URL: https://jlcpcb.com/partdetail/C137034
pins: 1, 2
1 alternate drawing of the same symbol

## RC2010JK-0762RL
designator R?  Resistance: 62Ω  (hidden comment: *)
Resistor, 62Ω, ±5%, 750mW, 200V, ±100ppm/℃, -55℃~+155℃, SMD 2010; Manufacturer: Uniroyal; Manufacturer Part Number: RC2010JK-0762RL; Supplier 1: LCSC; Supplier Part Number 1: C606213; JLCPCB Part Number: C606213; Power Rating: 750mW; Category: Resistors; Package Size: 2010; JLCPCB Basic Part: Yes; Tolerance: ±5%; Voltage Rating: 200V; Temperature Coefficient: ±100ppm/℃; Temperature Rating: -55℃~+155℃; ComponentLink1Description: Datasheet; ComponentLink1URL: https://wmsc.lcsc.com/wmsc/upload/file/pdf/v2/lcsc/2006112334_YAGEO-RC2010JK-0762RL_C606213.pdf; ComponentLink2Description: JLCPCB Part URL; ComponentLink2URL: https://jlcpcb.com/partdetail/C606213
pins: 1, 2
1 alternate drawing of the same symbol

## RC2010JK-0768KL
designator R?  Resistance: 68kΩ  (hidden comment: *)
Resistor, 68kΩ, ±5%, 750mW, 200V, ±100ppm/℃, -55℃~+155℃, SMD 2010; Manufacturer: Uniroyal; Manufacturer Part Number: RC2010JK-0768KL; Supplier 1: LCSC; Supplier Part Number 1: C326812; JLCPCB Part Number: C326812; Power Rating: 750mW; Category: Resistors; Package Size: 2010; JLCPCB Basic Part: Yes; Tolerance: ±5%; Voltage Rating: 200V; Temperature Coefficient: ±100ppm/℃; Temperature Rating: -55℃~+155℃; ComponentLink1Description: Datasheet; ComponentLink1URL: https://wmsc.lcsc.com/wmsc/upload/file/pdf/v2/lcsc/2112231430_YAGEO-RC2010JK-0768KL_C326812.pdf; ComponentLink2Description: JLCPCB Part URL; ComponentLink2URL: https://jlcpcb.com/partdetail/C326812
pins: 1, 2
1 alternate drawing of the same symbol

## RC2010JK-0768RL
designator R?  Resistance: 68Ω  (hidden comment: *)
Resistor, 68Ω, ±5%, 750mW, 200V, ±100ppm/℃, -55℃~+155℃, SMD 2010; Manufacturer: Uniroyal; Manufacturer Part Number: RC2010JK-0768RL; Supplier 1: LCSC; Supplier Part Number 1: C1883571; JLCPCB Part Number: C1883571; Power Rating: 750mW; Category: Resistors; Package Size: 2010; JLCPCB Basic Part: Yes; Tolerance: ±5%; Voltage Rating: 200V; Temperature Coefficient: ±100ppm/℃; Temperature Rating: -55℃~+155℃; ComponentLink1Description: Datasheet; ComponentLink1URL: https://wmsc.lcsc.com/wmsc/upload/file/pdf/v2/lcsc/2201280500_YAGEO-RC2010JK-0768RL_C1883571.pdf; ComponentLink2Description: JLCPCB Part URL; ComponentLink2URL: https://jlcpcb.com/partdetail/C1883571
pins: 1, 2
1 alternate drawing of the same symbol

## RC2010JK-0775KL
designator R?  Resistance: 75kΩ  (hidden comment: *)
Resistor, 75kΩ, ±5%, 750mW, 200V, ±100ppm/℃, -55℃~+155℃, SMD 2010; Manufacturer: Uniroyal; Manufacturer Part Number: RC2010JK-0775KL; Supplier 1: LCSC; Supplier Part Number 1: C2935253; JLCPCB Part Number: C2935253; Power Rating: 750mW; Category: Resistors; Package Size: 2010; JLCPCB Basic Part: Yes; Tolerance: ±5%; Voltage Rating: 200V; Temperature Coefficient: ±100ppm/℃; Temperature Rating: -55℃~+155℃; ComponentLink1Description: Datasheet; ComponentLink1URL: https://wmsc.lcsc.com/wmsc/upload/file/pdf/v2/lcsc/2201121700_YAGEO-RC2010JK-0775KL_C2935253.pdf; ComponentLink2Description: JLCPCB Part URL; ComponentLink2URL: https://jlcpcb.com/partdetail/C2935253
pins: 1, 2
1 alternate drawing of the same symbol

## RC2010JK-0775RL
designator R?  Resistance: 75Ω  (hidden comment: *)
Resistor, 75Ω, ±5%, 750mW, 200V, ±100ppm/℃, -55℃~+155℃, SMD 2010; Manufacturer: Uniroyal; Manufacturer Part Number: RC2010JK-0775RL; Supplier 1: LCSC; Supplier Part Number 1: C137033; JLCPCB Part Number: C137033; Power Rating: 750mW; Category: Resistors; Package Size: 2010; JLCPCB Basic Part: Yes; Tolerance: ±5%; Voltage Rating: 200V; Temperature Coefficient: ±100ppm/℃; Temperature Rating: -55℃~+155℃; ComponentLink1Description: Datasheet; ComponentLink1URL: https://wmsc.lcsc.com/wmsc/upload/file/pdf/v2/lcsc/2304140030_YAGEO-RC2010JK-0775RL_C137033.pdf; ComponentLink2Description: JLCPCB Part URL; ComponentLink2URL: https://jlcpcb.com/partdetail/C137033
pins: 1, 2
1 alternate drawing of the same symbol

## RC2010JK-07100KL
designator R?  Resistance: 100kΩ  (hidden comment: *)
Resistor, 100kΩ, ±5%, 750mW, 200V, ±100ppm/℃, -55℃~+155℃, SMD 2010; Manufacturer: Uniroyal; Manufacturer Part Number: RC2010JK-07100KL; Supplier 1: LCSC; Supplier Part Number 1: C606205; JLCPCB Part Number: C606205; Power Rating: 750mW; Category: Resistors; Package Size: 2010; JLCPCB Basic Part: Yes; Tolerance: ±5%; Voltage Rating: 200V; Temperature Coefficient: ±100ppm/℃; Temperature Rating: -55℃~+155℃; ComponentLink1Description: Datasheet; ComponentLink1URL: https://wmsc.lcsc.com/wmsc/upload/file/pdf/v2/lcsc/2006112333_YAGEO-RC2010JK-07100KL_C606205.pdf; ComponentLink2Description: JLCPCB Part URL; ComponentLink2URL: https://jlcpcb.com/partdetail/C606205
pins: 1, 2
1 alternate drawing of the same symbol
